# Altium footprint library LED.PcbLib: 35 footprints (part 2 of 3)
Each footprint in its own frame and in the unit in brackets; x right, y up, seen from the top. Pads: shape width x height; smd on the part's side, far side on the other; paste and mask are expansions set on the pad; w line width, h text height; cw(c..) or ccw(c..) is an arc to the next point about the centre after c.
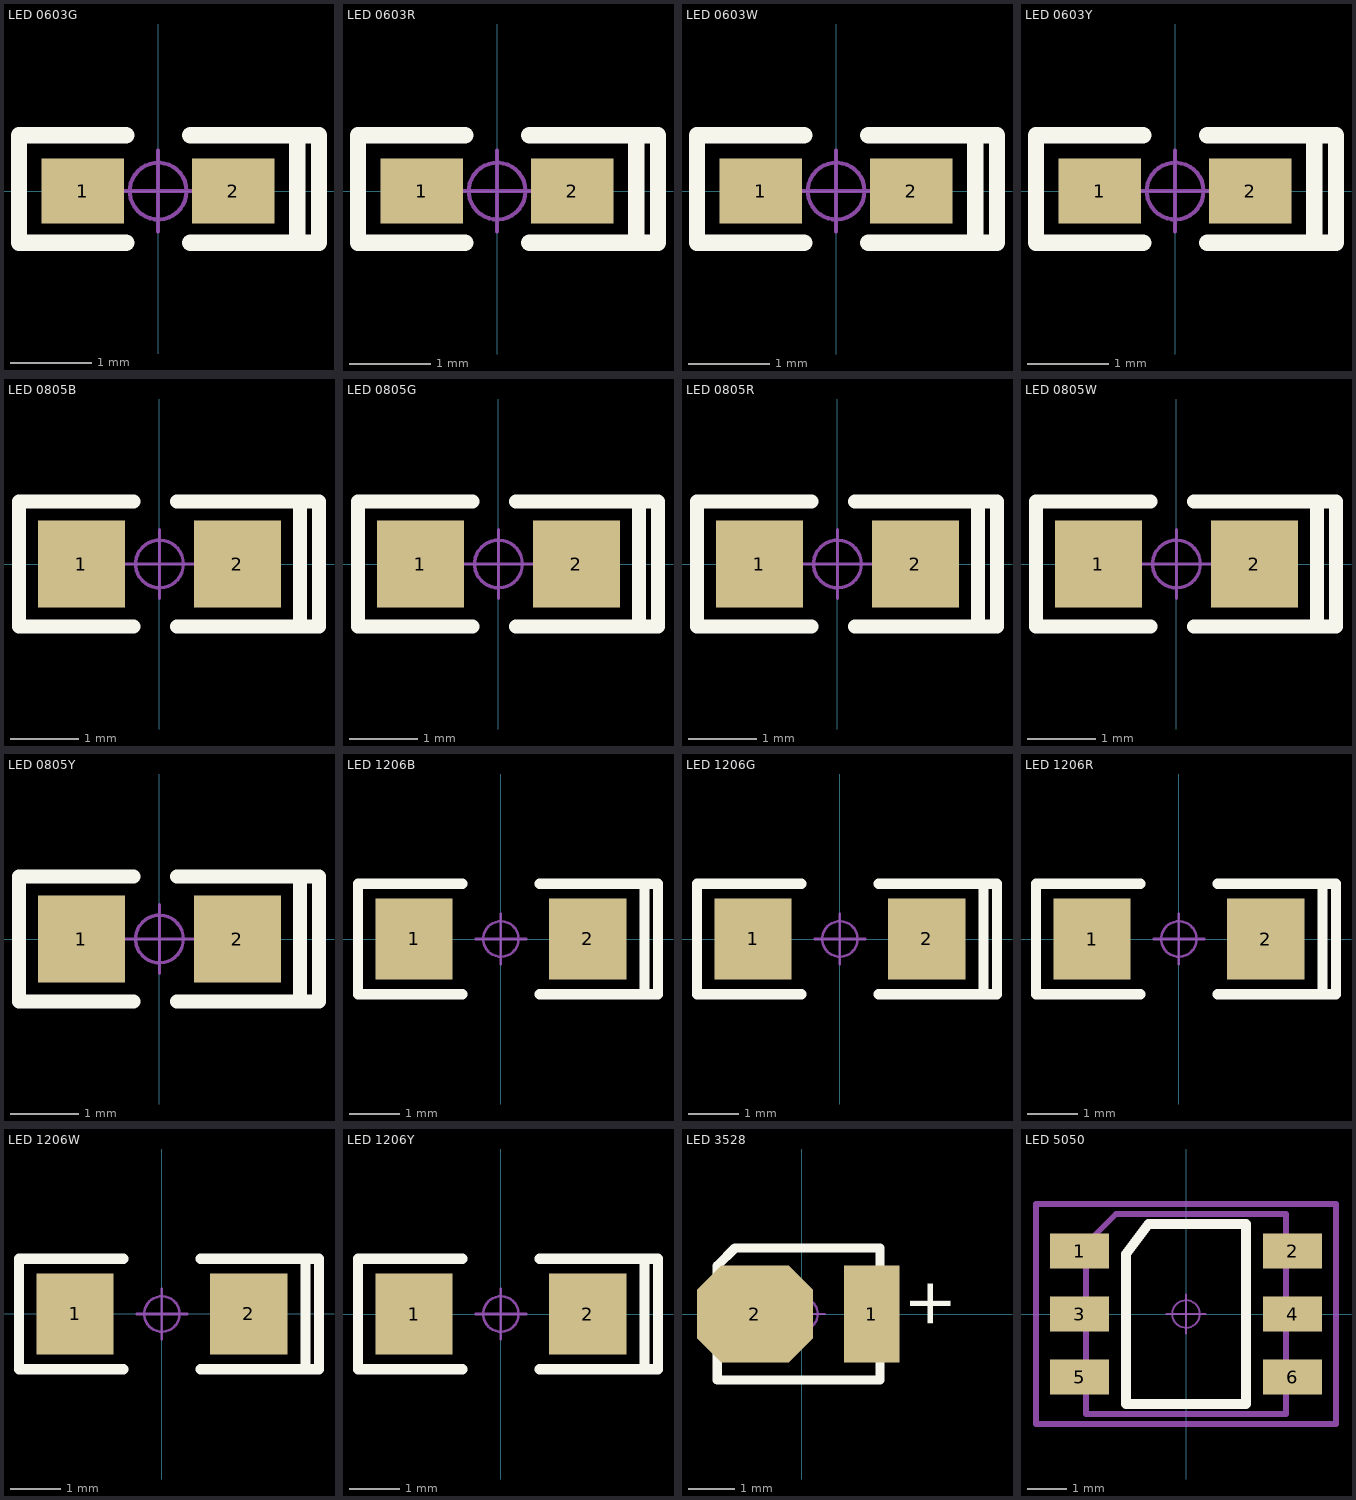
[diagram p1: the footprints below, top view; thin cyan lines are the x and y axes]

## LED 0603G [mm] "绿色0603LED"
pads (2):
  rect 1.016x0.8 smd: 1(-0.927,0) 2(0.927,0)
Top Overlay:
  lines w0.203: -0.394,-0.635 -1.714,-0.635 -1.714,0.686 -0.394,0.686 ; 0.394,-0.635 1.981,-0.635 1.981,0.686 0.394,0.686 ; 1.714,-0.635 1.714,0.66
Mechanical 15:
  circle w0.05: c0,0 r0.35
  lines w0.05: -0.5,0 0.5,0 ; 0,-0.5 0,0.5
3D body "LED 0603玻璃罩.STEP": height 0.61, standoff 0.21, extent -0.599,-0.401 0.599,0.401
3D body "LED 0603-G.STEP": height 0.47, standoff 0, extent -0.8,-0.401 0.8,0.401

## LED 0603R [mm] "红色0603LED"
pads (2):
  rect 1.016x0.8 smd: 1(-0.927,0) 2(0.927,0)
Top Overlay:
  lines w0.203: -0.394,-0.635 -1.714,-0.635 -1.714,0.686 -0.394,0.686 ; 0.394,-0.635 1.981,-0.635 1.981,0.686 0.394,0.686 ; 1.715,-0.635 1.715,0.661
Mechanical 15:
  circle w0.05: c0,0 r0.35
  lines w0.05: -0.5,0 0.5,0 ; 0,-0.5 0,0.5
3D body "LED 0603-R.STEP": height 0.47, standoff 0, extent -0.8,-0.401 0.8,0.401
3D body "LED 0603玻璃罩.STEP": height 0.61, standoff 0.21, extent -0.599,-0.401 0.599,0.401

## LED 0603W [mil] "白色0603LED"
pads (2):
  rect 40x31.5 smd: 1(-36.5,0) 2(36.5,0)
Top Overlay:
  lines w8: -15.5,-25 -67.5,-25 -67.5,27 -15.5,27 ; 15.5,-25 78,-25 78,27 15.5,27 ; 67.5,-25 67.5,26
Mechanical 15:
  circle w1.97: c0,0 r13.78
  lines w1.97: -19.68,0 19.68,0 ; 0,-19.68 0,19.68
3D body "LED 0603玻璃罩.STEP": height 23.82, standoff 8.07, extent -23.58,-15.79 23.58,15.79
3D body "LED 0603-W.STEP": height 18.36, standoff -0.16, extent -31.49,-15.79 31.5,15.79

## LED 0603Y [mm] "黄色0603LED"
pads (2):
  rect 1.016x0.8 smd: 1(-0.927,0) 2(0.927,0)
Top Overlay:
  lines w0.203: -0.394,-0.635 -1.714,-0.635 -1.714,0.686 -0.394,0.686 ; 0.394,-0.635 1.981,-0.635 1.981,0.686 0.394,0.686 ; 1.715,-0.635 1.715,0.66
Mechanical 15:
  circle w0.05: c0,0 r0.35
  lines w0.05: -0.5,0 0.5,0 ; 0,-0.5 0,0.5
3D body "LED 0603玻璃罩.STEP": height 0.61, standoff 0.21, extent -0.599,-0.401 0.599,0.401
3D body "LED 0603-Y.STEP": height 0.47, standoff 0, extent -0.8,-0.408 0.8,0.395

## LED 0805B [mil] "蓝色0805LED"
pads (2):
  rect 50x50 smd: 1(-45,0) 2(45,0)
Top Overlay:
  lines w8: -15,-36 -81,-36 -81,36 -15,36 ; 10,-36 80,-36 ; 10,36 80,36 ; 76,-36 92,-36 92,36 76,36 ; 81,-36 81,36
Mechanical 15:
  circle w1.97: c0,0 r13.78
  lines w1.97: -19.68,0 19.68,0 ; 0,-19.68 0,19.68
3D body "LED 0805-B.STEP": height 26.33, standoff -0.16, extent -39.37,-24.65 39.37,24.65
3D body "LED 0805玻璃罩.STEP": height 31.69, standoff 12.01, extent -29.49,-24.65 29.49,24.65

## LED 0805G [mil] "绿色0805LED"
pads (2):
  rect 50x50 smd: 1(-45,0) 2(45,0)
Top Overlay:
  lines w8: -15,-36 -81,-36 -81,36 -15,36 ; 10,-36 80,-36 ; 10,36 80,36 ; 76,-36 92,-36 92,36 76,36 ; 81,-36 81,36
Mechanical 15:
  circle w1.97: c0,0 r13.78
  lines w1.97: -19.68,0 19.68,0 ; 0,-19.68 0,19.68
3D body "LED 0805-G.STEP": height 26.33, standoff -0.16, extent -39.37,-24.65 39.37,24.65
3D body "LED 0805玻璃罩.STEP": height 31.69, standoff 12.01, extent -29.49,-24.65 29.49,24.65

## LED 0805R [mil] "红色0805LED"
pads (2):
  rect 50x50 smd: 1(-45,0) 2(45,0)
Top Overlay:
  lines w8: -15,-36 -81,-36 -81,36 -15,36 ; 10,-36 80,-36 ; 10,36 80,36 ; 76,-36 92,-36 92,36 76,36 ; 81.01,-35.99 81.01,36.01
Mechanical 15:
  circle w1.97: c0,0 r13.78
  lines w1.97: -19.68,0 19.68,0 ; 0,-19.68 0,19.68
3D body "LED 0805-R.STEP": height 26.33, standoff -0.16, extent -39.37,-24.65 39.37,24.64
3D body "LED 0805玻璃罩.STEP": height 31.69, standoff 12.01, extent -29.49,-24.65 29.49,24.65

## LED 0805W [mil] "白色0805LED"
pads (2):
  rect 50x50 smd: 1(-45,0) 2(45,0)
Top Overlay:
  lines w8: -15,-36 -81,-36 -81,36 -15,36 ; 10.01,-35.99 80.01,-35.99 ; 10.01,36.01 80.01,36.01 ; 76.01,-35.99 92.01,-35.99 92.01,36.01 76.01,36.01 ; 81.01,-35.99 81.01,36.01
Mechanical 15:
  circle w1.97: c0,0 r13.78
  lines w1.97: -19.68,0 19.68,0 ; 0,-19.68 0,19.68
3D body "LED 0805-W.STEP": height 26.33, standoff -0.16, extent -39.37,-24.65 39.37,24.64
3D body "LED 0805玻璃罩.STEP": height 31.69, standoff 12.01, extent -29.49,-24.65 29.49,24.65

## LED 0805Y [mm] "黄色0805LED"
pads (2):
  rect 1.27x1.27 smd: 1(-1.143,0) 2(1.143,0)
Top Overlay:
  lines w0.203: -0.381,-0.914 -2.057,-0.914 -2.057,0.914 -0.381,0.914 ; 0.254,-0.914 2.032,-0.914 ; 0.254,0.914 2.032,0.914 ; 1.93,-0.914 2.337,-0.914 2.337,0.914 1.93,0.914 ; 2.058,-0.914 2.058,0.915
Mechanical 15:
  circle w0.05: c0,0 r0.35
  lines w0.05: -0.5,0 0.5,0 ; 0,-0.5 0,0.5
3D body "LED 0805-Y.STEP": height 0.67, standoff 0, extent -1,-0.626 1,0.626
3D body "LED 0805玻璃罩.STEP": height 0.8, standoff 0.31, extent -0.749,-0.626 0.749,0.626

## LED 1206B [mm] "蓝色1206LED"
pads (2):
  rect 1.524x1.6 smd: 1(-1.714,0) 2(1.715,0)
Top Overlay:
  lines w0.203: -0.762,-1.092 -2.819,-1.092 -2.819,1.092 -2.769,1.092 -0.762,1.092 ; 0.762,-1.092 3.099,-1.092 3.099,1.092 0.762,1.092 ; 2.832,-1.092 2.832,1.092
Mechanical 15:
  circle w0.05: c0,0 r0.35
  lines w0.05: -0.5,0 0.5,0 ; 0,-0.5 0,0.5
3D body "LED 1206玻璃罩.STEP": height 1, standoff 0.51, extent -1.126,-0.801 1.126,0.801
3D body "LED 1206-B.STEP": height 0.9, standoff 0, extent -1.601,-0.801 1.601,0.801

## LED 1206G [mm] "绿色1206LED"
pads (2):
  rect 1.524x1.6 smd: 1(-1.714,0) 2(1.715,0)
Top Overlay:
  lines w0.203: -2.819,1.092 -2.819,-1.092 -0.762,-1.092 ; -2.769,1.092 -0.762,1.092 ; 0.762,-1.092 3.099,-1.092 3.099,1.092 0.762,1.092 ; 2.832,-1.092 2.832,1.092
Mechanical 15:
  circle w0.05: c0,0 r0.35
  lines w0.05: -0.5,0 0.5,0 ; 0,-0.5 0,0.5
3D body "LED 1206玻璃罩.STEP": height 1, standoff 0.51, extent -1.126,-0.801 1.126,0.801
3D body "LED 1206-G.STEP": height 0.9, standoff 0, extent -1.601,-0.801 1.601,0.801

## LED 1206R [mil] "红色1206LED"
pads (2):
  rect 60x62.99 smd: 1(-67.5,0) 2(67.5,0)
Top Overlay:
  lines w8: -111.01,43 -111.01,-43 -30.01,-43 ; -109.01,43 -30.01,43 ; 30,-43 122,-43 122,43 30,43 ; 111.51,-43 111.51,43
Mechanical 15:
  circle w1.97: c0,0 r13.78
  lines w1.97: -19.68,0 19.68,0 ; 0,-19.68 0,19.68
3D body "LED 1206玻璃罩.STEP": height 39.57, standoff 19.88, extent -44.33,-31.54 44.33,31.54
3D body "LED 1206-R.STEP": height 35.58, standoff -0.16, extent -63.03,-31.54 63.03,31.54

## LED 1206W [mil] "白色1206LED"
pads (2):
  rect 60x62.99 smd: 1(-67.5,0) 2(67.5,0)
Top Overlay:
  lines w8: -111.01,43 -111.01,-43 -30.01,-43 ; -109.01,43 -30.01,43 ; 30,-43 122,-43 122,43 30,43 ; 111.5,-43 111.5,43
Mechanical 15:
  circle w1.97: c0,0 r13.78
  lines w1.97: -19.68,0 19.68,0 ; 0,-19.68 0,19.68
3D body "LED 1206-W.STEP": height 35.58, standoff -0.16, extent -63.03,-31.54 63.03,31.54
3D body "LED 1206玻璃罩.STEP": height 39.57, standoff 19.88, extent -44.33,-31.54 44.33,31.54

## LED 1206Y [mil] "黄色1206LED"
pads (2):
  rect 60x62.99 smd: 1(-67.5,0) 2(67.5,0)
Top Overlay:
  lines w8: -111.01,43 -111.01,-43 -30.01,-43 ; -109.01,43 -30.01,43 ; 30,-43 122,-43 122,43 30,43 ; 111.51,-43 111.51,43
Mechanical 15:
  circle w1.97: c0,0 r13.78
  lines w1.97: -19.68,0 19.68,0 ; 0,-19.68 0,19.68
3D body "LED 1206-Y.STEP": height 35.58, standoff -0.16, extent -63.03,-31.54 63.03,31.54
3D body "LED 1206玻璃罩.STEP": height 39.57, standoff 19.88, extent -44.33,-31.54 44.33,31.54

## LED 3528 [mm] "红色3528LED"
pads (2):
  rect 1.2x2.1 smd: 1(1.511,0)
  oct 2.5x2.1 smd: 2(-1.003,0)
Top Overlay:
  lines w0.2: -1.816,-1.422 1.689,-1.422 1.689,1.422 -1.435,1.422 -1.816,1.041 -1.816,-1.422
  text "+" at 3.213,-0.356 h1
Mechanical 15:
  circle w0.05: c0,0 r0.35
  lines w0.05: -0.5,0 0.5,0 ; 0,-0.5 0,0.5
3D body "LED 3528 透明胶.STEP": height 1.95, standoff 1.2, extent -1.195,-1.195 1.195,1.195
3D body "LED 3528 基体.STEP": height 1.95, standoff 0.05, extent -1.75,-1.4 1.75,1.4

## LED 5050 [mm] "白色5050LED"
pads (6):
  rect 1.5x0.9 smd: 1(-2.705,1.6) 2(2.705,1.6) 3(-2.705,0) 4(2.705,0) 5(-2.705,-1.6) 6(2.705,-1.6)
Top Overlay:
  lines w0.254: -1.524,-2.286 1.524,-2.286 1.524,2.286 -0.953,2.286 -1.524,1.524 -1.524,-2.286
Mechanical 13:
  lines w0.15: -2.54,-2.54 2.54,-2.54 2.54,2.54 -1.778,2.54 -2.54,1.778 -2.54,-2.54
Mechanical 15:
  circle w0.05: c0,0 r0.35
  lines w0.05: -0.5,0 0.5,0 ; 0,-0.5 0,0.5
  lines w0.15: -3.81,-2.794 3.81,-2.794 3.81,2.794 -3.81,2.794 -3.81,-2.794
3D body "LED 5050 透明胶.STEP": height 1.65, standoff 0.67, extent -1.995,-1.995 1.995,1.995
3D body "LED 5050 基体.STEP": height 1.65, standoff 0.05, extent -2.7,-2.5 2.7,2.5